# Altium footprint library SAMTEC SMD.PcbLib: 165 footprints (part 14 of 17)
Each footprint in its own frame and in the unit in brackets; x right, y up, seen from the top. Pads: shape width x height; smd on the part's side, far side on the other; paste and mask are expansions set on the pad; w line width, h text height; cw(c..) or ccw(c..) is an arc to the next point about the centre after c.
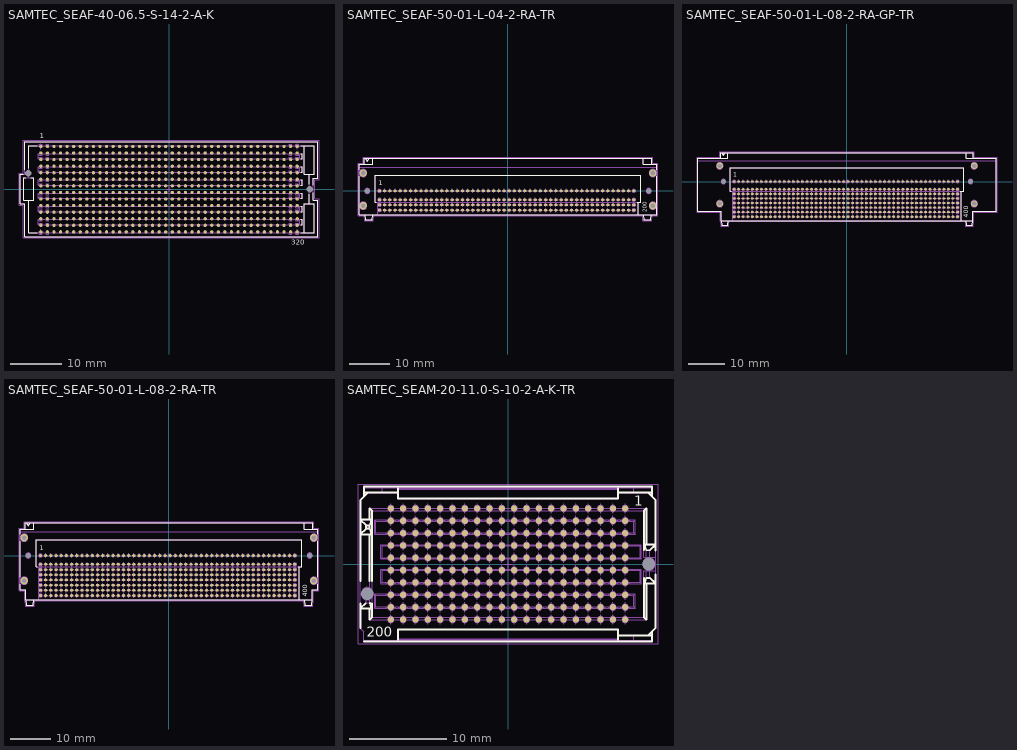
[diagram p13: the footprints below, top view; thin cyan lines are the x and y axes]

## SAMTEC_SEAF-40-06.5-S-14-2-A-K [mm] "560 contacts (14 rows x 40 Columns) High-Speed/High-Density Open-Pin-Field Connector"
height 6.55
pads (562):
  round 0.64 smd paste+0.125: 1(-24.765,8.255) 2(-24.765,6.985) 3(-24.765,5.715) 4(-24.765,4.445) 5(-24.765,3.175) 6(-24.765,1.905) 7(-24.765,0.635) 8(-24.765,-0.635) 9(-24.765,-1.905) 10(-24.765,-3.175) 11(-24.765,-4.445) 12(-24.765,-5.715) 13(-24.765,-6.985) 14(-24.765,-8.255) 15(-23.495,8.255) 16(-23.495,6.985) 17(-23.495,5.715) 18(-23.495,4.445) 19(-23.495,3.175) 20(-23.495,1.905) 21(-23.495,0.635) 22(-23.495,-0.635) 23(-23.495,-1.905) 24(-23.495,-3.175) 25(-23.495,-4.445) 26(-23.495,-5.715) 27(-23.495,-6.985) 28(-23.495,-8.255) 29(-22.225,8.255) 30(-22.225,6.985) 31(-22.225,5.715) 32(-22.225,4.445) 33(-22.225,3.175) 34(-22.225,1.905) 35(-22.225,0.635) 36(-22.225,-0.635) 37(-22.225,-1.905) 38(-22.225,-3.175) 39(-22.225,-4.445) 40(-22.225,-5.715) 41(-22.225,-6.985) 42(-22.225,-8.255) 43(-20.955,8.255) 44(-20.955,6.985) 45(-20.955,5.715) 46(-20.955,4.445) 47(-20.955,3.175) 48(-20.955,1.905) 49(-20.955,0.635) 50(-20.955,-0.635) 51(-20.955,-1.905) 52(-20.955,-3.175) 53(-20.955,-4.445) 54(-20.955,-5.715) 55(-20.955,-6.985) 56(-20.955,-8.255) 57(-19.685,8.255) 58(-19.685,6.985) 59(-19.685,5.715) 60(-19.685,4.445) 61(-19.685,3.175) 62(-19.685,1.905) 63(-19.685,0.635) 64(-19.685,-0.635) 65(-19.685,-1.905) 66(-19.685,-3.175) 67(-19.685,-4.445) 68(-19.685,-5.715) 69(-19.685,-6.985) 70(-19.685,-8.255) 71(-18.415,8.255) 72(-18.415,6.985) 73(-18.415,5.715) 74(-18.415,4.445) 75(-18.415,3.175) 76(-18.415,1.905) 77(-18.415,0.635) 78(-18.415,-0.635) 79(-18.415,-1.905) 80(-18.415,-3.175) 81(-18.415,-4.445) 82(-18.415,-5.715) 83(-18.415,-6.985) 84(-18.415,-8.255) 85(-17.145,8.255) 86(-17.145,6.985) 87(-17.145,5.715) 88(-17.145,4.445) 89(-17.145,3.175) 90(-17.145,1.905) 91(-17.145,0.635) 92(-17.145,-0.635) 93(-17.145,-1.905) 94(-17.145,-3.175) 95(-17.145,-4.445) 96(-17.145,-5.715) 97(-17.145,-6.985) 98(-17.145,-8.255) 99(-15.875,8.255) 100(-15.875,6.985) 101(-15.875,5.715) 102(-15.875,4.445) 103(-15.875,3.175) 104(-15.875,1.905) 105(-15.875,0.635) 106(-15.875,-0.635) 107(-15.875,-1.905) 108(-15.875,-3.175) 109(-15.875,-4.445) 110(-15.875,-5.715) 111(-15.875,-6.985) 112(-15.875,-8.255) 113(-14.605,8.255) 114(-14.605,6.985) 115(-14.605,5.715) 116(-14.605,4.445) 117(-14.605,3.175) 118(-14.605,1.905) 119(-14.605,0.635) 120(-14.605,-0.635) 121(-14.605,-1.905) 122(-14.605,-3.175) 123(-14.605,-4.445) 124(-14.605,-5.715) 125(-14.605,-6.985) 126(-14.605,-8.255) 127(-13.335,8.255) 128(-13.335,6.985) 129(-13.335,5.715) 130(-13.335,4.445) 131(-13.335,3.175) 132(-13.335,1.905) 133(-13.335,0.635) 134(-13.335,-0.635) 135(-13.335,-1.905) 136(-13.335,-3.175) 137(-13.335,-4.445) 138(-13.335,-5.715) 139(-13.335,-6.985) 140(-13.335,-8.255) 141(-12.065,8.255) 142(-12.065,6.985) 143(-12.065,5.715) 144(-12.065,4.445) 145(-12.065,3.175) 146(-12.065,1.905) 147(-12.065,0.635) 148(-12.065,-0.635) 149(-12.065,-1.905) 150(-12.065,-3.175) 151(-12.065,-4.445) 152(-12.065,-5.715) 153(-12.065,-6.985) 154(-12.065,-8.255) 155(-10.795,8.255) 156(-10.795,6.985) 157(-10.795,5.715) 158(-10.795,4.445) 159(-10.795,3.175) 160(-10.795,1.905) 161(-10.795,0.635) 162(-10.795,-0.635) 163(-10.795,-1.905) 164(-10.795,-3.175) 165(-10.795,-4.445) 166(-10.795,-5.715) 167(-10.795,-6.985) 168(-10.795,-8.255) 169(-9.525,8.255) 170(-9.525,6.985) 171(-9.525,5.715) 172(-9.525,4.445) 173(-9.525,3.175) 174(-9.525,1.905) 175(-9.525,0.635) 176(-9.525,-0.635) 177(-9.525,-1.905) 178(-9.525,-3.175) 179(-9.525,-4.445) 180(-9.525,-5.715) 181(-9.525,-6.985) 182(-9.525,-8.255) 183(-8.255,8.255) 184(-8.255,6.985) 185(-8.255,5.715) 186(-8.255,4.445) 187(-8.255,3.175) 188(-8.255,1.905) 189(-8.255,0.635) 190(-8.255,-0.635) 191(-8.255,-1.905) 192(-8.255,-3.175) 193(-8.255,-4.445) 194(-8.255,-5.715) 195(-8.255,-6.985) 196(-8.255,-8.255) 197(-6.985,8.255) 198(-6.985,6.985) 199(-6.985,5.715) 200(-6.985,4.445) 201(-6.985,3.175) 202(-6.985,1.905) 203(-6.985,0.635) 204(-6.985,-0.635) 205(-6.985,-1.905) 206(-6.985,-3.175) 207(-6.985,-4.445) 208(-6.985,-5.715) 209(-6.985,-6.985) 210(-6.985,-8.255) 211(-5.715,8.255) 212(-5.715,6.985) 213(-5.715,5.715) 214(-5.715,4.445) 215(-5.715,3.175) 216(-5.715,1.905) 217(-5.715,0.635) 218(-5.715,-0.635) 219(-5.715,-1.905) 220(-5.715,-3.175) 221(-5.715,-4.445) 222(-5.715,-5.715) 223(-5.715,-6.985) 224(-5.715,-8.255) 225(-4.445,8.255) 226(-4.445,6.985) 227(-4.445,5.715) 228(-4.445,4.445) 229(-4.445,3.175) 230(-4.445,1.905) 231(-4.445,0.635) 232(-4.445,-0.635) 233(-4.445,-1.905) 234(-4.445,-3.175) 235(-4.445,-4.445) 236(-4.445,-5.715) 237(-4.445,-6.985) 238(-4.445,-8.255) 239(-3.175,8.255) 240(-3.175,6.985) 241(-3.175,5.715) 242(-3.175,4.445) 243(-3.175,3.175) 244(-3.175,1.905) 245(-3.175,0.635) 246(-3.175,-0.635) 247(-3.175,-1.905) 248(-3.175,-3.175) 249(-3.175,-4.445) 250(-3.175,-5.715) 251(-3.175,-6.985) 252(-3.175,-8.255) 253(-1.905,8.255) 254(-1.905,6.985) 255(-1.905,5.715) 256(-1.905,4.445) 257(-1.905,3.175) 258(-1.905,1.905) 259(-1.905,0.635) 260(-1.905,-0.635) 261(-1.905,-1.905) 262(-1.905,-3.175) 263(-1.905,-4.445) 264(-1.905,-5.715) 265(-1.905,-6.985) 266(-1.905,-8.255) 267(-0.635,8.255) 268(-0.635,6.985) 269(-0.635,5.715) 270(-0.635,4.445) 271(-0.635,3.175) 272(-0.635,1.905) 273(-0.635,0.635) 274(-0.635,-0.635) 275(-0.635,-1.905) 276(-0.635,-3.175) 277(-0.635,-4.445) 278(-0.635,-5.715) 279(-0.635,-6.985) 280(-0.635,-8.255) 281(0.635,8.255) 282(0.635,6.985) 283(0.635,5.715) 284(0.635,4.445) 285(0.635,3.175) 286(0.635,1.905) 287(0.635,0.635) 288(0.635,-0.635) 289(0.635,-1.905) 290(0.635,-3.175) 291(0.635,-4.445) 292(0.635,-5.715) 293(0.635,-6.985) 294(0.635,-8.255) 295(1.905,8.255) 296(1.905,6.985) 297(1.905,5.715) 298(1.905,4.445) 299(1.905,3.175) 300(1.905,1.905) 301(1.905,0.635) 302(1.905,-0.635) 303(1.905,-1.905) 304(1.905,-3.175) 305(1.905,-4.445) 306(1.905,-5.715) 307(1.905,-6.985) 308(1.905,-8.255) 309(3.175,8.255) 310(3.175,6.985) 311(3.175,5.715) 312(3.175,4.445) 313(3.175,3.175) 314(3.175,1.905) 315(3.175,0.635) 316(3.175,-0.635) 317(3.175,-1.905) 318(3.175,-3.175) 319(3.175,-4.445) 320(3.175,-5.715) 321(3.175,-6.985) 322(3.175,-8.255) 323(4.445,8.255) 324(4.445,6.985) 325(4.445,5.715) 326(4.445,4.445) 327(4.445,3.175) 328(4.445,1.905) 329(4.445,0.635) 330(4.445,-0.635) 331(4.445,-1.905) 332(4.445,-3.175) 333(4.445,-4.445) 334(4.445,-5.715) 335(4.445,-6.985) 336(4.445,-8.255) 337(5.715,8.255) 338(5.715,6.985) 339(5.715,5.715) 340(5.715,4.445) 341(5.715,3.175) 342(5.715,1.905) 343(5.715,0.635) 344(5.715,-0.635) 345(5.715,-1.905) 346(5.715,-3.175) 347(5.715,-4.445) 348(5.715,-5.715) 349(5.715,-6.985) 350(5.715,-8.255) 351(6.985,8.255) 352(6.985,6.985) 353(6.985,5.715) 354(6.985,4.445) 355(6.985,3.175) 356(6.985,1.905) 357(6.985,0.635) 358(6.985,-0.635) 359(6.985,-1.905) 360(6.985,-3.175) 361(6.985,-4.445) 362(6.985,-5.715) 363(6.985,-6.985) 364(6.985,-8.255) 365(8.255,8.255) 366(8.255,6.985) 367(8.255,5.715) 368(8.255,4.445) 369(8.255,3.175) 370(8.255,1.905) 371(8.255,0.635) 372(8.255,-0.635) 373(8.255,-1.905) 374(8.255,-3.175) 375(8.255,-4.445) 376(8.255,-5.715) 377(8.255,-6.985) 378(8.255,-8.255) 379(9.525,8.255) 380(9.525,6.985) 381(9.525,5.715) 382(9.525,4.445) 383(9.525,3.175) 384(9.525,1.905) 385(9.525,0.635) 386(9.525,-0.635) 387(9.525,-1.905) 388(9.525,-3.175) 389(9.525,-4.445) 390(9.525,-5.715) 391(9.525,-6.985) 392(9.525,-8.255) 393(10.795,8.255) 394(10.795,6.985) 395(10.795,5.715) 396(10.795,4.445) 397(10.795,3.175) 398(10.795,1.905) 399(10.795,0.635) 400(10.795,-0.635) 401(10.795,-1.905) 402(10.795,-3.175) 403(10.795,-4.445) 404(10.795,-5.715) 405(10.795,-6.985) 406(10.795,-8.255) 407(12.065,8.255) 408(12.065,6.985) 409(12.065,5.715) 410(12.065,4.445) 411(12.065,3.175) 412(12.065,1.905) 413(12.065,0.635) 414(12.065,-0.635) 415(12.065,-1.905) 416(12.065,-3.175) 417(12.065,-4.445) 418(12.065,-5.715) 419(12.065,-6.985) 420(12.065,-8.255) 421(13.335,8.255) 422(13.335,6.985) 423(13.335,5.715) 424(13.335,4.445) 425(13.335,3.175) 426(13.335,1.905) 427(13.335,0.635) 428(13.335,-0.635) 429(13.335,-1.905) 430(13.335,-3.175) 431(13.335,-4.445) 432(13.335,-5.715) 433(13.335,-6.985) 434(13.335,-8.255) 435(14.605,8.255) 436(14.605,6.985) 437(14.605,5.715) 438(14.605,4.445) 439(14.605,3.175) 440(14.605,1.905) 441(14.605,0.635) 442(14.605,-0.635) 443(14.605,-1.905) 444(14.605,-3.175) 445(14.605,-4.445) 446(14.605,-5.715) 447(14.605,-6.985) 448(14.605,-8.255) 449(15.875,8.255) 450(15.875,6.985) 451(15.875,5.715) 452(15.875,4.445) 453(15.875,3.175) 454(15.875,1.905) 455(15.875,0.635) 456(15.875,-0.635) 457(15.875,-1.905) 458(15.875,-3.175) 459(15.875,-4.445) 460(15.875,-5.715) 461(15.875,-6.985) 462(15.875,-8.255) 463(17.145,8.255) 464(17.145,6.985) 465(17.145,5.715) 466(17.145,4.445) 467(17.145,3.175) 468(17.145,1.905) 469(17.145,0.635) 470(17.145,-0.635) 471(17.145,-1.905) 472(17.145,-3.175) 473(17.145,-4.445) 474(17.145,-5.715) 475(17.145,-6.985) 476(17.145,-8.255) 477(18.415,8.255) 478(18.415,6.985) 479(18.415,5.715) 480(18.415,4.445) 481(18.415,3.175) 482(18.415,1.905) 483(18.415,0.635) 484(18.415,-0.635) 485(18.415,-1.905) 486(18.415,-3.175) 487(18.415,-4.445) 488(18.415,-5.715) 489(18.415,-6.985) 490(18.415,-8.255) 491(19.685,8.255) 492(19.685,6.985) 493(19.685,5.715) 494(19.685,4.445) 495(19.685,3.175) 496(19.685,1.905) 497(19.685,0.635) 498(19.685,-0.635) 499(19.685,-1.905) 500(19.685,-3.175) 501(19.685,-4.445) 502(19.685,-5.715) 503(19.685,-6.985) 504(19.685,-8.255) 505(20.955,8.255) 506(20.955,6.985) 507(20.955,5.715) 508(20.955,4.445) 509(20.955,3.175) 510(20.955,1.905) 511(20.955,0.635) 512(20.955,-0.635) 513(20.955,-1.905) 514(20.955,-3.175) 515(20.955,-4.445) 516(20.955,-5.715) 517(20.955,-6.985) 518(20.955,-8.255) 519(22.225,8.255) 520(22.225,6.985) 521(22.225,5.715) 522(22.225,4.445) 523(22.225,3.175) 524(22.225,1.905) 525(22.225,0.635) 526(22.225,-0.635) 527(22.225,-1.905) 528(22.225,-3.175) 529(22.225,-4.445) 530(22.225,-5.715) 531(22.225,-6.985) 532(22.225,-8.255) 533(23.495,8.255) 534(23.495,6.985) 535(23.495,5.715) 536(23.495,4.445) 537(23.495,3.175) 538(23.495,1.905) 539(23.495,0.635) 540(23.495,-0.635) 541(23.495,-1.905) 542(23.495,-3.175) 543(23.495,-4.445) 544(23.495,-5.715) 545(23.495,-6.985) 546(23.495,-8.255) 547(24.765,8.255) 548(24.765,6.985) 549(24.765,5.715) 550(24.765,4.445) 551(24.765,3.175) 552(24.765,1.905) 553(24.765,0.635) 554(24.765,-0.635) 555(24.765,-1.905) 556(24.765,-3.175) 557(24.765,-4.445) 558(24.765,-5.715) 559(24.765,-6.985) 560(24.765,-8.255)
  round 0.5 hole 1.3 unplated mask+0.4: MEC1(-27.19,3.05) MEC2(27.19,0)
Top Overlay:
  lines w0.2: -28.169,2.845 -28.727,2.845 -28.727,-2.845 -27.889,-2.845 -27.889,-9.182 28.727,-9.182 28.727,-2.096 27.889,-2.096 27.889,-0.715 ; -27.889,3.765 -27.889,9.182 28.727,9.182 28.727,2.095 27.889,2.095 27.889,0.715 ; -27.691,2.184 -28.067,2.184 -28.067,-2.184 -26.137,-2.184 -26.137,2.184 -26.689,2.184 ; -27.051,-2.184 -27.051,-8.395 -25.42,-8.395 ; -27.051,4.04 -27.051,8.395 -25.42,8.395 ; 25.42,-8.395 28.067,-8.395 28.067,-2.858 26.137,-2.858 26.137,-8.395 ; 25.42,8.395 28.067,8.395 28.067,2.857 26.137,2.857 26.137,8.395 ; 25.425,-6.871 25.756,-6.871 25.756,-5.829 25.425,-5.829 ; 25.425,-4.331 25.756,-4.331 25.756,-3.289 25.425,-3.289 ; 25.425,-1.791 25.756,-1.791 25.756,-0.749 25.425,-0.749 ; 25.425,0.749 25.756,0.749 25.756,1.791 25.425,1.791 ; 25.425,3.289 25.756,3.289 25.756,4.331 25.425,4.331 ; 25.425,5.829 25.756,5.829 25.756,6.871 25.425,6.871 ; 27.051,-2.858 27.051,-0.99 ; 27.051,0.99 27.051,2.857
  text "1" at -24.924,9.842 h1
  text "320" at 23.613,-10.782 h1
Mechanical 8:
  lines w0.05: -27.69,3.05 -27.19,3.05 ; -27.19,2.55 -27.19,3.05 ; -27.19,3.55 -27.19,3.05 ; -26.69,3.05 -27.19,3.05 ; -25.265,-8.255 -24.765,-8.255 ; -25.265,8.255 -24.765,8.255 ; -24.765,-8.755 -24.765,-8.255 ; -24.765,-7.755 -24.765,-8.255 ; -24.765,7.755 -24.765,8.255 ; -24.765,8.755 -24.765,8.255 ; -24.265,-8.255 -24.765,-8.255 ; -24.265,8.255 -24.765,8.255 ; -0.5,0 0,0 ; 0,-0.5 0,0 ; 0,0.5 0,0 ; 0.5,0 0,0 ; 24.265,-8.255 24.765,-8.255 ; 24.265,8.255 24.765,8.255 ; 24.765,-8.755 24.765,-8.255 ; 24.765,-7.755 24.765,-8.255 ; 24.765,7.755 24.765,8.255 ; 24.765,8.755 24.765,8.255 ; 25.265,-8.255 24.765,-8.255 ; 25.265,8.255 24.765,8.255 ; 26.69,0 27.19,0 ; 27.19,-0.5 27.19,0 ; 27.19,0.5 27.19,0 ; 27.69,0 27.19,0
Mechanical 14:
  drawing of 293 lines, arcs and shapes, not listed
  text "1" at -24.924,9.842 h1
  text "1" at -24.924,9.842 h1
  text "320" at 23.613,-10.782 h1
Mechanical 15:
  lines w0.05: -28.977,-3.095 -28.139,-3.095 -28.139,-9.432 28.977,-9.432 28.977,-1.846 28.139,-1.846 28.139,1.845 28.977,1.845 28.977,9.432 -28.139,9.432 -28.139,3.095 -28.977,3.095 -28.977,-3.095
3D body "SEAF-40-06.5-S-14-2-A-K.stp": height 4.83, standoff -3, extent -28.727,-9.182 28.727,9.182

## SAMTEC_SEAF-50-01-L-04-2-RA-TR [mm] "200 Contacts in 4 rows (50 Pin per Row), Hi-Density Right Angle Open Pin Field Connector"
height 7.91
pads (206):
  oval 0.84x0.63 smd paste+0.1: 1(-31.445,0) 2(-31.445,-2.159) 3(-31.445,-3.43) 4(-31.445,-4.7) 5(-30.175,0) 6(-30.175,-2.159) 7(-30.175,-3.43) 8(-30.175,-4.7) 9(-28.905,0) 10(-28.905,-2.159) 11(-28.905,-3.43) 12(-28.905,-4.7) 13(-27.635,0) 14(-27.635,-2.159) 15(-27.635,-3.43) 16(-27.635,-4.7) 17(-26.365,0) 18(-26.365,-2.159) 19(-26.365,-3.43) 20(-26.365,-4.7) 21(-25.095,0) 22(-25.095,-2.159) 23(-25.095,-3.43) 24(-25.095,-4.7) 25(-23.825,0) 26(-23.825,-2.159) 27(-23.825,-3.43) 28(-23.825,-4.7) 29(-22.555,0) 30(-22.555,-2.159) 31(-22.555,-3.43) 32(-22.555,-4.7) 33(-21.285,0) 34(-21.285,-2.159) 35(-21.285,-3.43) 36(-21.285,-4.7) 37(-20.015,0) 38(-20.015,-2.159) 39(-20.015,-3.43) 40(-20.015,-4.7) 41(-18.745,0) 42(-18.745,-2.159) 43(-18.745,-3.43) 44(-18.745,-4.7) 45(-17.475,0) 46(-17.475,-2.159) 47(-17.475,-3.43) 48(-17.475,-4.7) 49(-16.205,0) 50(-16.205,-2.159) 51(-16.205,-3.43) 52(-16.205,-4.7) 53(-14.935,0) 54(-14.935,-2.159) 55(-14.935,-3.43) 56(-14.935,-4.7) 57(-13.665,0) 58(-13.665,-2.159) 59(-13.665,-3.43) 60(-13.665,-4.7) 61(-12.395,0) 62(-12.395,-2.159) 63(-12.395,-3.43) 64(-12.395,-4.7) 65(-11.125,0) 66(-11.125,-2.159) 67(-11.125,-3.43) 68(-11.125,-4.7) 69(-9.855,0) 70(-9.855,-2.159) 71(-9.855,-3.43) 72(-9.855,-4.7) 73(-8.585,0) 74(-8.585,-2.159) 75(-8.585,-3.43) 76(-8.585,-4.7) 77(-7.315,0) 78(-7.315,-2.159) 79(-7.315,-3.43) 80(-7.315,-4.7) 81(-6.045,0) 82(-6.045,-2.159) 83(-6.045,-3.43) 84(-6.045,-4.7) 85(-4.775,0) 86(-4.775,-2.159) 87(-4.775,-3.43) 88(-4.775,-4.7) 89(-3.505,0) 90(-3.505,-2.159) 91(-3.505,-3.43) 92(-3.505,-4.7) 93(-2.235,0) 94(-2.235,-2.159) 95(-2.235,-3.43) 96(-2.235,-4.7) 97(-0.965,0) 98(-0.965,-2.159) 99(-0.965,-3.43) 100(-0.965,-4.7) 101(0.305,0) 102(0.305,-2.159) 103(0.305,-3.43) 104(0.305,-4.7) 105(1.575,0) 106(1.575,-2.159) 107(1.575,-3.43) 108(1.575,-4.7) 109(2.845,0) 110(2.845,-2.159) 111(2.845,-3.43) 112(2.845,-4.7) 113(4.115,0) 114(4.115,-2.159) 115(4.115,-3.43) 116(4.115,-4.7) 117(5.385,0) 118(5.385,-2.159) 119(5.385,-3.43) 120(5.385,-4.7) 121(6.655,0) 122(6.655,-2.159) 123(6.655,-3.43) 124(6.655,-4.7) 125(7.925,0) 126(7.925,-2.159) 127(7.925,-3.43) 128(7.925,-4.7) 129(9.195,0) 130(9.195,-2.159) 131(9.195,-3.43) 132(9.195,-4.7) 133(10.465,0) 134(10.465,-2.159) 135(10.465,-3.43) 136(10.465,-4.7) 137(11.735,0) 138(11.735,-2.159) 139(11.735,-3.43) 140(11.735,-4.7) 141(13.005,0) 142(13.005,-2.159) 143(13.005,-3.43) 144(13.005,-4.7) 145(14.275,0) 146(14.275,-2.159) 147(14.275,-3.43) 148(14.275,-4.7) 149(15.545,0) 150(15.545,-2.159) 151(15.545,-3.43) 152(15.545,-4.7) 153(16.815,0) 154(16.815,-2.159) 155(16.815,-3.43) 156(16.815,-4.7) 157(18.085,0) 158(18.085,-2.159) 159(18.085,-3.43) 160(18.085,-4.7) 161(19.355,0) 162(19.355,-2.159) 163(19.355,-3.43) 164(19.355,-4.7) 165(20.625,0) 166(20.625,-2.159) 167(20.625,-3.43) 168(20.625,-4.7) 169(21.895,0) 170(21.895,-2.159) 171(21.895,-3.43) 172(21.895,-4.7) 173(23.165,0) 174(23.165,-2.159) 175(23.165,-3.43) 176(23.165,-4.7) 177(24.435,0) 178(24.435,-2.159) 179(24.435,-3.43) 180(24.435,-4.7) 181(25.705,0) 182(25.705,-2.159) 183(25.705,-3.43) 184(25.705,-4.7) 185(26.975,0) 186(26.975,-2.159) 187(26.975,-3.43) 188(26.975,-4.7) 189(28.245,0) 190(28.245,-2.159) 191(28.245,-3.43) 192(28.245,-4.7) 193(29.515,0) 194(29.515,-2.159) 195(29.515,-3.43) 196(29.515,-4.7) 197(30.785,0) 198(30.785,-2.159) 199(30.785,-3.43) 200(30.785,-4.7)
  round 0.5 hole 1.3 unplated mask+0.4: MEC1(34.415,0) MEC2(-34.415,0)
  round 1.85 hole 1.15: MEC3(35.435,-3.62) MEC4(35.435,4.38) MEC5(-35.435,-3.62) MEC6(-35.435,4.38)
Top Overlay:
  lines w0.2: -36.449,3.527 -36.449,-5.78 36.449,-5.78 36.449,3.527 ; -36.449,5.233 -36.449,6.463 -33.147,6.463 -33.147,7.987 ; -35.179,6.463 -35.179,7.987 35.179,7.987 35.179,6.463 ; -35.014,-5.78 -34.95,-7.05 -33.172,-7.05 -33.109,-5.78 ; -34.867,7.987 -34.417,7.287 -33.967,7.987 ; -32.265,-2.732 -32.461,-2.732 -32.461,3.872 32.461,3.872 32.461,-2.732 31.605,-2.732 ; 31.852,-5.78 31.852,-2.732 ; 33.109,-5.78 33.172,-7.05 34.95,-7.05 35.014,-5.78 ; 33.147,7.987 33.147,6.463 36.449,6.463 36.449,5.233
  text "200" at 33.975,-5.18 h1
  text "1" at -31.625,1.35 h1.2
Mechanical 8:
  drawing of 871 lines, arcs and shapes, not listed
Mechanical 14:
  lines w0.1: -35.179,6.463 -35.179,7.987 35.179,7.987 35.179,6.463 ; -35.014,-5.78 -34.95,-7.05 -33.172,-7.05 -33.109,-5.78 ; -34.867,7.987 -34.417,7.287 -33.967,7.987 ; -33.147,7.987 -33.147,6.463 -36.449,6.463 -36.449,-5.78 36.449,-5.78 36.449,6.463 33.147,6.463 33.147,7.987 ; -31.852,-5.78 -31.852,-2.732 ; 31.852,-5.78 31.852,-2.732 ; 33.109,-5.78 33.172,-7.05 34.95,-7.05 35.014,-5.78 ; -32.461,-2.732 32.461,-2.732 32.461,3.872 -32.461,3.872 -32.461,-2.732
  text "200" at 33.975,-5.18 h1
  text "1" at -31.625,1.35 h1.2
Mechanical 15:
  lines w0.05: -36.699,-6.03 -36.699,6.713 -35.429,6.713 -35.429,8.237 35.429,8.237 35.429,6.713 36.699,6.713 36.699,-6.03 35.252,-6.03 35.188,-7.3 32.922,-7.3 32.922,-6.03 -32.871,-6.03 -32.935,-7.3 -35.188,-7.3 -35.252,-6.03 -36.699,-6.03
3D body "SAMTEC_SEAF-50-01-L-04-2-RA-TR.stp": height 7.92, standoff -1.5, extent -36.449,-7.05 36.449,7.987

## SAMTEC_SEAF-50-01-L-08-2-RA-GP-TR [mm] "400 Contacts in 8 rows (50 Pin per Row), Hi-Density Right Angle Open Pin Field Connector (Guide Post Option)"
height 12.99
pads (406):
  oval 0.84x0.63 smd paste+0.1: 1(-31.445,0) 2(-31.445,-2.159) 3(-31.445,-3.43) 4(-31.445,-4.7) 5(-31.445,-5.97) 6(-31.445,-7.24) 7(-31.445,-8.51) 8(-31.445,-9.78) 9(-30.175,0) 10(-30.175,-2.159) 11(-30.175,-3.43) 12(-30.175,-4.7) 13(-30.175,-5.97) 14(-30.175,-7.24) 15(-30.175,-8.51) 16(-30.175,-9.78) 17(-28.905,0) 18(-28.905,-2.159) 19(-28.905,-3.43) 20(-28.905,-4.7) 21(-28.905,-5.97) 22(-28.905,-7.24) 23(-28.905,-8.51) 24(-28.905,-9.78) 25(-27.635,0) 26(-27.635,-2.159) 27(-27.635,-3.43) 28(-27.635,-4.7) 29(-27.635,-5.97) 30(-27.635,-7.24) 31(-27.635,-8.51) 32(-27.635,-9.78) 33(-26.365,0) 34(-26.365,-2.159) 35(-26.365,-3.43) 36(-26.365,-4.7) 37(-26.365,-5.97) 38(-26.365,-7.24) 39(-26.365,-8.51) 40(-26.365,-9.78) 41(-25.095,0) 42(-25.095,-2.159) 43(-25.095,-3.43) 44(-25.095,-4.7) 45(-25.095,-5.97) 46(-25.095,-7.24) 47(-25.095,-8.51) 48(-25.095,-9.78) 49(-23.825,0) 50(-23.825,-2.159) 51(-23.825,-3.43) 52(-23.825,-4.7) 53(-23.825,-5.97) 54(-23.825,-7.24) 55(-23.825,-8.51) 56(-23.825,-9.78) 57(-22.555,0) 58(-22.555,-2.159) 59(-22.555,-3.43) 60(-22.555,-4.7) 61(-22.555,-5.97) 62(-22.555,-7.24) 63(-22.555,-8.51) 64(-22.555,-9.78) 65(-21.285,0) 66(-21.285,-2.159) 67(-21.285,-3.43) 68(-21.285,-4.7) 69(-21.285,-5.97) 70(-21.285,-7.24) 71(-21.285,-8.51) 72(-21.285,-9.78) 73(-20.015,0) 74(-20.015,-2.159) 75(-20.015,-3.43) 76(-20.015,-4.7) 77(-20.015,-5.97) 78(-20.015,-7.24) 79(-20.015,-8.51) 80(-20.015,-9.78) 81(-18.745,0) 82(-18.745,-2.159) 83(-18.745,-3.43) 84(-18.745,-4.7) 85(-18.745,-5.97) 86(-18.745,-7.24) 87(-18.745,-8.51) 88(-18.745,-9.78) 89(-17.475,0) 90(-17.475,-2.159) 91(-17.475,-3.43) 92(-17.475,-4.7) 93(-17.475,-5.97) 94(-17.475,-7.24) 95(-17.475,-8.51) 96(-17.475,-9.78) 97(-16.205,0) 98(-16.205,-2.159) 99(-16.205,-3.43) 100(-16.205,-4.7) 101(-16.205,-5.97) 102(-16.205,-7.24) 103(-16.205,-8.51) 104(-16.205,-9.78) 105(-14.935,0) 106(-14.935,-2.159) 107(-14.935,-3.43) 108(-14.935,-4.7) 109(-14.935,-5.97) 110(-14.935,-7.24) 111(-14.935,-8.51) 112(-14.935,-9.78) 113(-13.665,0) 114(-13.665,-2.159) 115(-13.665,-3.43) 116(-13.665,-4.7) 117(-13.665,-5.97) 118(-13.665,-7.24) 119(-13.665,-8.51) 120(-13.665,-9.78) 121(-12.395,0) 122(-12.395,-2.159) 123(-12.395,-3.43) 124(-12.395,-4.7) 125(-12.395,-5.97) 126(-12.395,-7.24) 127(-12.395,-8.51) 128(-12.395,-9.78) 129(-11.125,0) 130(-11.125,-2.159) 131(-11.125,-3.43) 132(-11.125,-4.7) 133(-11.125,-5.97) 134(-11.125,-7.24) 135(-11.125,-8.51) 136(-11.125,-9.78) 137(-9.855,0) 138(-9.855,-2.159) 139(-9.855,-3.43) 140(-9.855,-4.7) 141(-9.855,-5.97) 142(-9.855,-7.24) 143(-9.855,-8.51) 144(-9.855,-9.78) 145(-8.585,0) 146(-8.585,-2.159) 147(-8.585,-3.43) 148(-8.585,-4.7) 149(-8.585,-5.97) 150(-8.585,-7.24) 151(-8.585,-8.51) 152(-8.585,-9.78) 153(-7.315,0) 154(-7.315,-2.159) 155(-7.315,-3.43) 156(-7.315,-4.7) 157(-7.315,-5.97) 158(-7.315,-7.24) 159(-7.315,-8.51) 160(-7.315,-9.78) 161(-6.045,0) 162(-6.045,-2.159) 163(-6.045,-3.43) 164(-6.045,-4.7) 165(-6.045,-5.97) 166(-6.045,-7.24) 167(-6.045,-8.51) 168(-6.045,-9.78) 169(-4.775,0) 170(-4.775,-2.159) 171(-4.775,-3.43) 172(-4.775,-4.7) 173(-4.775,-5.97) 174(-4.775,-7.24) 175(-4.775,-8.51) 176(-4.775,-9.78) 177(-3.505,0) 178(-3.505,-2.159) 179(-3.505,-3.43) 180(-3.505,-4.7) 181(-3.505,-5.97) 182(-3.505,-7.24) 183(-3.505,-8.51) 184(-3.505,-9.78) 185(-2.235,0) 186(-2.235,-2.159) 187(-2.235,-3.43) 188(-2.235,-4.7) 189(-2.235,-5.97) 190(-2.235,-7.24) 191(-2.235,-8.51) 192(-2.235,-9.78) 193(-0.965,0) 194(-0.965,-2.159) 195(-0.965,-3.43) 196(-0.965,-4.7) 197(-0.965,-5.97) 198(-0.965,-7.24) 199(-0.965,-8.51) 200(-0.965,-9.78) 201(0.305,0) 202(0.305,-2.159) 203(0.305,-3.43) 204(0.305,-4.7) 205(0.305,-5.97) 206(0.305,-7.24) 207(0.305,-8.51) 208(0.305,-9.78) 209(1.575,0) 210(1.575,-2.159) 211(1.575,-3.43) 212(1.575,-4.7) 213(1.575,-5.97) 214(1.575,-7.24) 215(1.575,-8.51) 216(1.575,-9.78) 217(2.845,0) 218(2.845,-2.159) 219(2.845,-3.43) 220(2.845,-4.7) 221(2.845,-5.97) 222(2.845,-7.24) 223(2.845,-8.51) 224(2.845,-9.78) 225(4.115,0) 226(4.115,-2.159) 227(4.115,-3.43) 228(4.115,-4.7) 229(4.115,-5.97) 230(4.115,-7.24) 231(4.115,-8.51) 232(4.115,-9.78) 233(5.385,0) 234(5.385,-2.159) 235(5.385,-3.43) 236(5.385,-4.7) 237(5.385,-5.97) 238(5.385,-7.24) 239(5.385,-8.51) 240(5.385,-9.78) 241(6.655,0) 242(6.655,-2.159) 243(6.655,-3.43) 244(6.655,-4.7) 245(6.655,-5.97) 246(6.655,-7.24) 247(6.655,-8.51) 248(6.655,-9.78) 249(7.925,0) 250(7.925,-2.159) 251(7.925,-3.43) 252(7.925,-4.7) 253(7.925,-5.97) 254(7.925,-7.24) 255(7.925,-8.51) 256(7.925,-9.78) 257(9.195,0) 258(9.195,-2.159) 259(9.195,-3.43) 260(9.195,-4.7) 261(9.195,-5.97) 262(9.195,-7.24) 263(9.195,-8.51) 264(9.195,-9.78) 265(10.465,0) 266(10.465,-2.159) 267(10.465,-3.43) 268(10.465,-4.7) 269(10.465,-5.97) 270(10.465,-7.24) 271(10.465,-8.51) 272(10.465,-9.78) 273(11.735,0) 274(11.735,-2.159) 275(11.735,-3.43) 276(11.735,-4.7) 277(11.735,-5.97) 278(11.735,-7.24) 279(11.735,-8.51) 280(11.735,-9.78) 281(13.005,0) 282(13.005,-2.159) 283(13.005,-3.43) 284(13.005,-4.7) 285(13.005,-5.97) 286(13.005,-7.24) 287(13.005,-8.51) 288(13.005,-9.78) 289(14.275,0) 290(14.275,-2.159) 291(14.275,-3.43) 292(14.275,-4.7) 293(14.275,-5.97) 294(14.275,-7.24) 295(14.275,-8.51) 296(14.275,-9.78) 297(15.545,0) 298(15.545,-2.159) 299(15.545,-3.43) 300(15.545,-4.7) 301(15.545,-5.97) 302(15.545,-7.24) 303(15.545,-8.51) 304(15.545,-9.78) 305(16.815,0) 306(16.815,-2.159) 307(16.815,-3.43) 308(16.815,-4.7) 309(16.815,-5.97) 310(16.815,-7.24) 311(16.815,-8.51) 312(16.815,-9.78) 313(18.085,0) 314(18.085,-2.159) 315(18.085,-3.43) 316(18.085,-4.7) 317(18.085,-5.97) 318(18.085,-7.24) 319(18.085,-8.51) 320(18.085,-9.78) 321(19.355,0) 322(19.355,-2.159) 323(19.355,-3.43) 324(19.355,-4.7) 325(19.355,-5.97) 326(19.355,-7.24) 327(19.355,-8.51) 328(19.355,-9.78) 329(20.625,0) 330(20.625,-2.159) 331(20.625,-3.43) 332(20.625,-4.7) 333(20.625,-5.97) 334(20.625,-7.24) 335(20.625,-8.51) 336(20.625,-9.78) 337(21.895,0) 338(21.895,-2.159) 339(21.895,-3.43) 340(21.895,-4.7) 341(21.895,-5.97) 342(21.895,-7.24) 343(21.895,-8.51) 344(21.895,-9.78) 345(23.165,0) 346(23.165,-2.159) 347(23.165,-3.43) 348(23.165,-4.7) 349(23.165,-5.97) 350(23.165,-7.24) 351(23.165,-8.51) 352(23.165,-9.78) 353(24.435,0) 354(24.435,-2.159) 355(24.435,-3.43) 356(24.435,-4.7) 357(24.435,-5.97) 358(24.435,-7.24) 359(24.435,-8.51) 360(24.435,-9.78) 361(25.705,0) 362(25.705,-2.159) 363(25.705,-3.43) 364(25.705,-4.7) 365(25.705,-5.97) 366(25.705,-7.24) 367(25.705,-8.51) 368(25.705,-9.78) 369(26.975,0) 370(26.975,-2.159) 371(26.975,-3.43) 372(26.975,-4.7) 373(26.975,-5.97) 374(26.975,-7.24) 375(26.975,-8.51) 376(26.975,-9.78) 377(28.245,0) 378(28.245,-2.159) 379(28.245,-3.43) 380(28.245,-4.7) 381(28.245,-5.97) 382(28.245,-7.24) 383(28.245,-8.51) 384(28.245,-9.78) 385(29.515,0) 386(29.515,-2.159) 387(29.515,-3.43) 388(29.515,-4.7) 389(29.515,-5.97) 390(29.515,-7.24) 391(29.515,-8.51) 392(29.515,-9.78) 393(30.785,0) 394(30.785,-2.159) 395(30.785,-3.43) 396(30.785,-4.7) 397(30.785,-5.97) 398(30.785,-7.24) 399(30.785,-8.51) 400(30.785,-9.78)